# Altium schematic symbol library jlcpcb_2025_04_resistors_extended_2010.schlib: 1697 symbols (part 4 of 9) (continued)
## CR2010F24K0E04Z (continued)
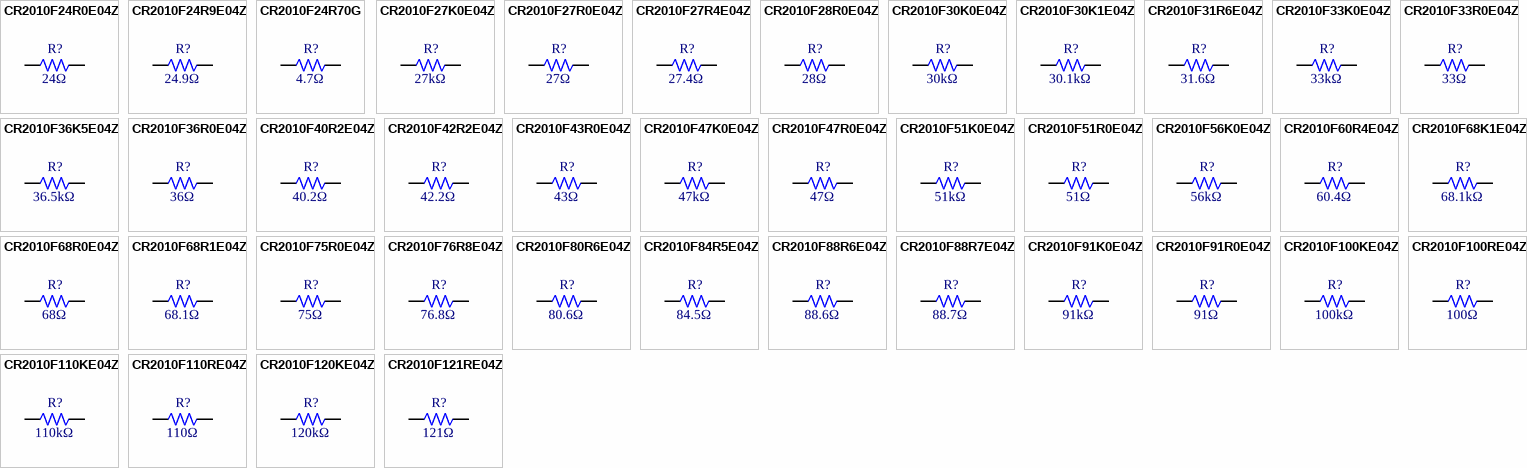
[diagram p17: symbols CR2010F24R0E04Z to CR2010F121RE04Z]

## CR2010F24R0E04Z
designator R?  Resistance: 24Ω  (hidden comment: *)
Resistor, 24Ω, ±1%, 750mW, 200V, ±100ppm/℃, -55℃~+155℃, SMD 2010; Manufacturer: Uniroyal; Manufacturer Part Number: CR2010F24R0E04Z; Supplier 1: LCSC; Supplier Part Number 1: C174973; JLCPCB Part Number: C174973; Power Rating: 750mW; Category: Resistors; Package Size: 2010; JLCPCB Basic Part: Yes; Tolerance: ±1%; Voltage Rating: 200V; Temperature Coefficient: ±100ppm/℃; Temperature Rating: -55℃~+155℃; ComponentLink1Description: Datasheet; ComponentLink1URL: https://wmsc.lcsc.com/wmsc/upload/file/pdf/v2/lcsc/2304140030_Ever-Ohms-Tech-CR2010F24R0E04Z_C174973.pdf; ComponentLink2Description: JLCPCB Part URL; ComponentLink2URL: https://jlcpcb.com/partdetail/C174973
pins: 1, 2
1 alternate drawing of the same symbol

## CR2010F24R9E04Z
designator R?  Resistance: 24.9Ω  (hidden comment: *)
Resistor, 24.9Ω, ±1%, 750mW, 200V, ±100ppm/℃, -55℃~+155℃, SMD 2010; Manufacturer: Uniroyal; Manufacturer Part Number: CR2010F24R9E04Z; Supplier 1: LCSC; Supplier Part Number 1: C174974; JLCPCB Part Number: C174974; Power Rating: 750mW; Category: Resistors; Package Size: 2010; JLCPCB Basic Part: Yes; Tolerance: ±1%; Voltage Rating: 200V; Temperature Coefficient: ±100ppm/℃; Temperature Rating: -55℃~+155℃; ComponentLink1Description: Datasheet; ComponentLink1URL: https://wmsc.lcsc.com/wmsc/upload/file/pdf/v2/lcsc/2304140030_Ever-Ohms-Tech-CR2010F24R9E04Z_C174974.pdf; ComponentLink2Description: JLCPCB Part URL; ComponentLink2URL: https://jlcpcb.com/partdetail/C174974
pins: 1, 2
1 alternate drawing of the same symbol

## CR2010F24R70G
designator R?  Resistance: 4.7Ω  (hidden comment: *)
Resistor, 4.7Ω, ±1%, 200V, SMD 2010; Manufacturer: Uniroyal; Manufacturer Part Number: CR2010F24R70G; Supplier 1: LCSC; Supplier Part Number 1: C3036992; JLCPCB Part Number: C3036992; Category: Resistors; Package Size: 2010; JLCPCB Basic Part: Yes; Tolerance: ±1%; Voltage Rating: 200V; ComponentLink1Description: Datasheet; ComponentLink1URL: https://wmsc.lcsc.com/wmsc/upload/file/pdf/v2/lcsc/2206222045_LIZ-Elec-CR2010F24R70G_C3036992.pdf; ComponentLink2Description: JLCPCB Part URL; ComponentLink2URL: https://jlcpcb.com/partdetail/C3036992
pins: 1, 2
1 alternate drawing of the same symbol

## CR2010F27K0E04Z
designator R?  Resistance: 27kΩ  (hidden comment: *)
Resistor, 27kΩ, ±1%, 750mW, 200V, ±100ppm/℃, -55℃~+155℃, SMD 2010; Manufacturer: Uniroyal; Manufacturer Part Number: CR2010F27K0E04Z; Supplier 1: LCSC; Supplier Part Number 1: C147084; JLCPCB Part Number: C147084; Power Rating: 750mW; Category: Resistors; Package Size: 2010; JLCPCB Basic Part: Yes; Tolerance: ±1%; Voltage Rating: 200V; Temperature Coefficient: ±100ppm/℃; Temperature Rating: -55℃~+155℃; ComponentLink1Description: Datasheet; ComponentLink1URL: https://wmsc.lcsc.com/wmsc/upload/file/pdf/v2/lcsc/2304140030_Ever-Ohms-Tech-CR2010F27K0E04Z_C147084.pdf; ComponentLink2Description: JLCPCB Part URL; ComponentLink2URL: https://jlcpcb.com/partdetail/C147084
pins: 1, 2
1 alternate drawing of the same symbol

## CR2010F27R0E04Z
designator R?  Resistance: 27Ω  (hidden comment: *)
Resistor, 27Ω, ±1%, 750mW, 200V, ±100ppm/℃, -55℃~+155℃, SMD 2010; Manufacturer: Uniroyal; Manufacturer Part Number: CR2010F27R0E04Z; Supplier 1: LCSC; Supplier Part Number 1: C146995; JLCPCB Part Number: C146995; Power Rating: 750mW; Category: Resistors; Package Size: 2010; JLCPCB Basic Part: Yes; Tolerance: ±1%; Voltage Rating: 200V; Temperature Coefficient: ±100ppm/℃; Temperature Rating: -55℃~+155℃; ComponentLink1Description: Datasheet; ComponentLink1URL: https://wmsc.lcsc.com/wmsc/upload/file/pdf/v2/lcsc/2304140030_Ever-Ohms-Tech-CR2010F27R0E04Z_C146995.pdf; ComponentLink2Description: JLCPCB Part URL; ComponentLink2URL: https://jlcpcb.com/partdetail/C146995
pins: 1, 2
1 alternate drawing of the same symbol

## CR2010F27R4E04Z
designator R?  Resistance: 27.4Ω  (hidden comment: *)
Resistor, 27.4Ω, ±1%, 750mW, 200V, ±100ppm/℃, -55℃~+155℃, SMD 2010; Manufacturer: Uniroyal; Manufacturer Part Number: CR2010F27R4E04Z; Supplier 1: LCSC; Supplier Part Number 1: C165391; JLCPCB Part Number: C165391; Power Rating: 750mW; Category: Resistors; Package Size: 2010; JLCPCB Basic Part: Yes; Tolerance: ±1%; Voltage Rating: 200V; Temperature Coefficient: ±100ppm/℃; Temperature Rating: -55℃~+155℃; ComponentLink1Description: Datasheet; ComponentLink1URL: https://wmsc.lcsc.com/wmsc/upload/file/pdf/v2/lcsc/2304140030_Ever-Ohms-Tech-CR2010F27R4E04Z_C165391.pdf; ComponentLink2Description: JLCPCB Part URL; ComponentLink2URL: https://jlcpcb.com/partdetail/C165391
pins: 1, 2
1 alternate drawing of the same symbol

## CR2010F28R0E04Z
designator R?  Resistance: 28Ω  (hidden comment: *)
Resistor, 28Ω, ±1%, 750mW, 200V, ±100ppm/℃, -55℃~+155℃, SMD 2010; Manufacturer: Uniroyal; Manufacturer Part Number: CR2010F28R0E04Z; Supplier 1: LCSC; Supplier Part Number 1: C174976; JLCPCB Part Number: C174976; Power Rating: 750mW; Category: Resistors; Package Size: 2010; JLCPCB Basic Part: Yes; Tolerance: ±1%; Voltage Rating: 200V; Temperature Coefficient: ±100ppm/℃; Temperature Rating: -55℃~+155℃; ComponentLink1Description: Datasheet; ComponentLink1URL: https://wmsc.lcsc.com/wmsc/upload/file/pdf/v2/lcsc/2304140030_Ever-Ohms-Tech-CR2010F28R0E04Z_C174976.pdf; ComponentLink2Description: JLCPCB Part URL; ComponentLink2URL: https://jlcpcb.com/partdetail/C174976
pins: 1, 2
1 alternate drawing of the same symbol

## CR2010F30K0E04Z
designator R?  Resistance: 30kΩ  (hidden comment: *)
Resistor, 30kΩ, ±1%, 750mW, 200V, ±100ppm/℃, -55℃~+155℃, SMD 2010; Manufacturer: Uniroyal; Manufacturer Part Number: CR2010F30K0E04Z; Supplier 1: LCSC; Supplier Part Number 1: C175093; JLCPCB Part Number: C175093; Power Rating: 750mW; Category: Resistors; Package Size: 2010; JLCPCB Basic Part: Yes; Tolerance: ±1%; Voltage Rating: 200V; Temperature Coefficient: ±100ppm/℃; Temperature Rating: -55℃~+155℃; ComponentLink1Description: Datasheet; ComponentLink1URL: https://wmsc.lcsc.com/wmsc/upload/file/pdf/v2/lcsc/2304140030_Ever-Ohms-Tech-CR2010F30K0E04Z_C175093.pdf; ComponentLink2Description: JLCPCB Part URL; ComponentLink2URL: https://jlcpcb.com/partdetail/C175093
pins: 1, 2
1 alternate drawing of the same symbol

## CR2010F30K1E04Z
designator R?  Resistance: 30.1kΩ  (hidden comment: *)
Resistor, 30.1kΩ, ±1%, 750mW, 200V, ±100ppm/℃, -55℃~+155℃, SMD 2010; Manufacturer: Uniroyal; Manufacturer Part Number: CR2010F30K1E04Z; Supplier 1: LCSC; Supplier Part Number 1: C165388; JLCPCB Part Number: C165388; Power Rating: 750mW; Category: Resistors; Package Size: 2010; JLCPCB Basic Part: Yes; Tolerance: ±1%; Voltage Rating: 200V; Temperature Coefficient: ±100ppm/℃; Temperature Rating: -55℃~+155℃; ComponentLink1Description: Datasheet; ComponentLink1URL: https://wmsc.lcsc.com/wmsc/upload/file/pdf/v2/lcsc/2304140030_Ever-Ohms-Tech-CR2010F30K1E04Z_C165388.pdf; ComponentLink2Description: JLCPCB Part URL; ComponentLink2URL: https://jlcpcb.com/partdetail/C165388
pins: 1, 2
1 alternate drawing of the same symbol

## CR2010F31R6E04Z
designator R?  Resistance: 31.6Ω  (hidden comment: *)
Resistor, 31.6Ω, ±1%, 750mW, 200V, ±100ppm/℃, -55℃~+155℃, SMD 2010; Manufacturer: Uniroyal; Manufacturer Part Number: CR2010F31R6E04Z; Supplier 1: LCSC; Supplier Part Number 1: C165387; JLCPCB Part Number: C165387; Power Rating: 750mW; Category: Resistors; Package Size: 2010; JLCPCB Basic Part: Yes; Tolerance: ±1%; Voltage Rating: 200V; Temperature Coefficient: ±100ppm/℃; Temperature Rating: -55℃~+155℃; ComponentLink1Description: Datasheet; ComponentLink1URL: https://wmsc.lcsc.com/wmsc/upload/file/pdf/v2/lcsc/2304140030_Ever-Ohms-Tech-CR2010F31R6E04Z_C165387.pdf; ComponentLink2Description: JLCPCB Part URL; ComponentLink2URL: https://jlcpcb.com/partdetail/C165387
pins: 1, 2
1 alternate drawing of the same symbol

## CR2010F33K0E04Z
designator R?  Resistance: 33kΩ  (hidden comment: *)
Resistor, 33kΩ, ±1%, 750mW, 200V, ±100ppm/℃, -55℃~+155℃, SMD 2010; Manufacturer: Uniroyal; Manufacturer Part Number: CR2010F33K0E04Z; Supplier 1: LCSC; Supplier Part Number 1: C165386; JLCPCB Part Number: C165386; Power Rating: 750mW; Category: Resistors; Package Size: 2010; JLCPCB Basic Part: Yes; Tolerance: ±1%; Voltage Rating: 200V; Temperature Coefficient: ±100ppm/℃; Temperature Rating: -55℃~+155℃; ComponentLink1Description: Datasheet; ComponentLink1URL: https://wmsc.lcsc.com/wmsc/upload/file/pdf/v2/lcsc/2304140030_Ever-Ohms-Tech-CR2010F33K0E04Z_C165386.pdf; ComponentLink2Description: JLCPCB Part URL; ComponentLink2URL: https://jlcpcb.com/partdetail/C165386
pins: 1, 2
1 alternate drawing of the same symbol

## CR2010F33R0E04Z
designator R?  Resistance: 33Ω  (hidden comment: *)
Resistor, 33Ω, ±1%, 750mW, 200V, ±100ppm/℃, -55℃~+155℃, SMD 2010; Manufacturer: Uniroyal; Manufacturer Part Number: CR2010F33R0E04Z; Supplier 1: LCSC; Supplier Part Number 1: C174978; JLCPCB Part Number: C174978; Power Rating: 750mW; Category: Resistors; Package Size: 2010; JLCPCB Basic Part: Yes; Tolerance: ±1%; Voltage Rating: 200V; Temperature Coefficient: ±100ppm/℃; Temperature Rating: -55℃~+155℃; ComponentLink1Description: Datasheet; ComponentLink1URL: https://wmsc.lcsc.com/wmsc/upload/file/pdf/v2/lcsc/2304140030_Ever-Ohms-Tech-CR2010F33R0E04Z_C174978.pdf; ComponentLink2Description: JLCPCB Part URL; ComponentLink2URL: https://jlcpcb.com/partdetail/C174978
pins: 1, 2
1 alternate drawing of the same symbol

## CR2010F36K5E04Z
designator R?  Resistance: 36.5kΩ  (hidden comment: *)
Resistor, 36.5kΩ, ±1%, 750mW, 200V, ±100ppm/℃, -55℃~+155℃, SMD 2010; Manufacturer: Uniroyal; Manufacturer Part Number: CR2010F36K5E04Z; Supplier 1: LCSC; Supplier Part Number 1: C175095; JLCPCB Part Number: C175095; Power Rating: 750mW; Category: Resistors; Package Size: 2010; JLCPCB Basic Part: Yes; Tolerance: ±1%; Voltage Rating: 200V; Temperature Coefficient: ±100ppm/℃; Temperature Rating: -55℃~+155℃; ComponentLink1Description: Datasheet; ComponentLink1URL: https://wmsc.lcsc.com/wmsc/upload/file/pdf/v2/lcsc/2304140030_Ever-Ohms-Tech-CR2010F36K5E04Z_C175095.pdf; ComponentLink2Description: JLCPCB Part URL; ComponentLink2URL: https://jlcpcb.com/partdetail/C175095
pins: 1, 2
1 alternate drawing of the same symbol

## CR2010F36R0E04Z
designator R?  Resistance: 36Ω  (hidden comment: *)
Resistor, 36Ω, ±1%, 750mW, 200V, ±100ppm/℃, -55℃~+155℃, SMD 2010; Manufacturer: Uniroyal; Manufacturer Part Number: CR2010F36R0E04Z; Supplier 1: LCSC; Supplier Part Number 1: C174981; JLCPCB Part Number: C174981; Power Rating: 750mW; Category: Resistors; Package Size: 2010; JLCPCB Basic Part: Yes; Tolerance: ±1%; Voltage Rating: 200V; Temperature Coefficient: ±100ppm/℃; Temperature Rating: -55℃~+155℃; ComponentLink1Description: Datasheet; ComponentLink1URL: https://wmsc.lcsc.com/wmsc/upload/file/pdf/v2/lcsc/2304140030_Ever-Ohms-Tech-CR2010F36R0E04Z_C174981.pdf; ComponentLink2Description: JLCPCB Part URL; ComponentLink2URL: https://jlcpcb.com/partdetail/C174981
pins: 1, 2
1 alternate drawing of the same symbol

## CR2010F40R2E04Z
designator R?  Resistance: 40.2Ω  (hidden comment: *)
Resistor, 40.2Ω, ±1%, 750mW, 200V, ±100ppm/℃, -55℃~+155℃, SMD 2010; Manufacturer: Uniroyal; Manufacturer Part Number: CR2010F40R2E04Z; Supplier 1: LCSC; Supplier Part Number 1: C175993; JLCPCB Part Number: C175993; Power Rating: 750mW; Category: Resistors; Package Size: 2010; JLCPCB Basic Part: Yes; Tolerance: ±1%; Voltage Rating: 200V; Temperature Coefficient: ±100ppm/℃; Temperature Rating: -55℃~+155℃; ComponentLink1Description: Datasheet; ComponentLink1URL: https://wmsc.lcsc.com/wmsc/upload/file/pdf/v2/lcsc/2304140030_Ever-Ohms-Tech-CR2010F40R2E04Z_C175993.pdf; ComponentLink2Description: JLCPCB Part URL; ComponentLink2URL: https://jlcpcb.com/partdetail/C175993
pins: 1, 2
1 alternate drawing of the same symbol

## CR2010F42R2E04Z
designator R?  Resistance: 42.2Ω  (hidden comment: *)
Resistor, 42.2Ω, ±1%, 750mW, 200V, ±100ppm/℃, -55℃~+155℃, SMD 2010; Manufacturer: Uniroyal; Manufacturer Part Number: CR2010F42R2E04Z; Supplier 1: LCSC; Supplier Part Number 1: C165377; JLCPCB Part Number: C165377; Power Rating: 750mW; Category: Resistors; Package Size: 2010; JLCPCB Basic Part: Yes; Tolerance: ±1%; Voltage Rating: 200V; Temperature Coefficient: ±100ppm/℃; Temperature Rating: -55℃~+155℃; ComponentLink1Description: Datasheet; ComponentLink1URL: https://wmsc.lcsc.com/wmsc/upload/file/pdf/v2/lcsc/2304140030_Ever-Ohms-Tech-CR2010F42R2E04Z_C165377.pdf; ComponentLink2Description: JLCPCB Part URL; ComponentLink2URL: https://jlcpcb.com/partdetail/C165377
pins: 1, 2
1 alternate drawing of the same symbol

## CR2010F43R0E04Z
designator R?  Resistance: 43Ω  (hidden comment: *)
Resistor, 43Ω, ±1%, 750mW, 200V, ±100ppm/℃, -55℃~+155℃, SMD 2010; Manufacturer: Uniroyal; Manufacturer Part Number: CR2010F43R0E04Z; Supplier 1: LCSC; Supplier Part Number 1: C174982; JLCPCB Part Number: C174982; Power Rating: 750mW; Category: Resistors; Package Size: 2010; JLCPCB Basic Part: Yes; Tolerance: ±1%; Voltage Rating: 200V; Temperature Coefficient: ±100ppm/℃; Temperature Rating: -55℃~+155℃; ComponentLink1Description: Datasheet; ComponentLink1URL: https://wmsc.lcsc.com/wmsc/upload/file/pdf/v2/lcsc/2304140030_Ever-Ohms-Tech-CR2010F43R0E04Z_C174982.pdf; ComponentLink2Description: JLCPCB Part URL; ComponentLink2URL: https://jlcpcb.com/partdetail/C174982
pins: 1, 2
1 alternate drawing of the same symbol

## CR2010F47K0E04Z
designator R?  Resistance: 47kΩ  (hidden comment: *)
Resistor, 47kΩ, ±1%, 750mW, 200V, ±100ppm/℃, -55℃~+155℃, SMD 2010; Manufacturer: Uniroyal; Manufacturer Part Number: CR2010F47K0E04Z; Supplier 1: LCSC; Supplier Part Number 1: C175100; JLCPCB Part Number: C175100; Power Rating: 750mW; Category: Resistors; Package Size: 2010; JLCPCB Basic Part: Yes; Tolerance: ±1%; Voltage Rating: 200V; Temperature Coefficient: ±100ppm/℃; Temperature Rating: -55℃~+155℃; ComponentLink1Description: Datasheet; ComponentLink1URL: https://wmsc.lcsc.com/wmsc/upload/file/pdf/v2/lcsc/2304140030_Ever-Ohms-Tech-CR2010F47K0E04Z_C175100.pdf; ComponentLink2Description: JLCPCB Part URL; ComponentLink2URL: https://jlcpcb.com/partdetail/C175100
pins: 1, 2
1 alternate drawing of the same symbol

## CR2010F47R0E04Z
designator R?  Resistance: 47Ω  (hidden comment: *)
Resistor, 47Ω, ±1%, 750mW, 200V, ±100ppm/℃, -55℃~+155℃, SMD 2010; Manufacturer: Uniroyal; Manufacturer Part Number: CR2010F47R0E04Z; Supplier 1: LCSC; Supplier Part Number 1: C174983; JLCPCB Part Number: C174983; Power Rating: 750mW; Category: Resistors; Package Size: 2010; JLCPCB Basic Part: Yes; Tolerance: ±1%; Voltage Rating: 200V; Temperature Coefficient: ±100ppm/℃; Temperature Rating: -55℃~+155℃; ComponentLink1Description: Datasheet; ComponentLink1URL: https://wmsc.lcsc.com/wmsc/upload/file/pdf/v2/lcsc/2304140030_Ever-Ohms-Tech-CR2010F47R0E04Z_C174983.pdf; ComponentLink2Description: JLCPCB Part URL; ComponentLink2URL: https://jlcpcb.com/partdetail/C174983
pins: 1, 2
1 alternate drawing of the same symbol

## CR2010F51K0E04Z
designator R?  Resistance: 51kΩ  (hidden comment: *)
Resistor, 51kΩ, ±1%, 750mW, 200V, ±100ppm/℃, -55℃~+155℃, SMD 2010; Manufacturer: Uniroyal; Manufacturer Part Number: CR2010F51K0E04Z; Supplier 1: LCSC; Supplier Part Number 1: C175103; JLCPCB Part Number: C175103; Power Rating: 750mW; Category: Resistors; Package Size: 2010; JLCPCB Basic Part: Yes; Tolerance: ±1%; Voltage Rating: 200V; Temperature Coefficient: ±100ppm/℃; Temperature Rating: -55℃~+155℃; ComponentLink1Description: Datasheet; ComponentLink1URL: https://wmsc.lcsc.com/wmsc/upload/file/pdf/v2/lcsc/2304140030_Ever-Ohms-Tech-CR2010F51K0E04Z_C175103.pdf; ComponentLink2Description: JLCPCB Part URL; ComponentLink2URL: https://jlcpcb.com/partdetail/C175103
pins: 1, 2
1 alternate drawing of the same symbol

## CR2010F51R0E04Z
designator R?  Resistance: 51Ω  (hidden comment: *)
Resistor, 51Ω, ±1%, 750mW, 200V, ±100ppm/℃, -55℃~+155℃, SMD 2010; Manufacturer: Uniroyal; Manufacturer Part Number: CR2010F51R0E04Z; Supplier 1: LCSC; Supplier Part Number 1: C147185; JLCPCB Part Number: C147185; Power Rating: 750mW; Category: Resistors; Package Size: 2010; JLCPCB Basic Part: Yes; Tolerance: ±1%; Voltage Rating: 200V; Temperature Coefficient: ±100ppm/℃; Temperature Rating: -55℃~+155℃; ComponentLink1Description: Datasheet; ComponentLink1URL: https://wmsc.lcsc.com/wmsc/upload/file/pdf/v2/lcsc/2304140030_Ever-Ohms-Tech-CR2010F51R0E04Z_C147185.pdf; ComponentLink2Description: JLCPCB Part URL; ComponentLink2URL: https://jlcpcb.com/partdetail/C147185
pins: 1, 2
1 alternate drawing of the same symbol

## CR2010F56K0E04Z
designator R?  Resistance: 56kΩ  (hidden comment: *)
Resistor, 56kΩ, ±1%, 750mW, 200V, ±100ppm/℃, -55℃~+155℃, SMD 2010; Manufacturer: Uniroyal; Manufacturer Part Number: CR2010F56K0E04Z; Supplier 1: LCSC; Supplier Part Number 1: C146997; JLCPCB Part Number: C146997; Power Rating: 750mW; Category: Resistors; Package Size: 2010; JLCPCB Basic Part: Yes; Tolerance: ±1%; Voltage Rating: 200V; Temperature Coefficient: ±100ppm/℃; Temperature Rating: -55℃~+155℃; ComponentLink1Description: Datasheet; ComponentLink1URL: https://wmsc.lcsc.com/wmsc/upload/file/pdf/v2/lcsc/2304140030_Ever-Ohms-Tech-CR2010F56K0E04Z_C146997.pdf; ComponentLink2Description: JLCPCB Part URL; ComponentLink2URL: https://jlcpcb.com/partdetail/C146997
pins: 1, 2
1 alternate drawing of the same symbol

## CR2010F60R4E04Z
designator R?  Resistance: 60.4Ω  (hidden comment: *)
Resistor, 60.4Ω, ±1%, 750mW, 200V, ±100ppm/℃, -55℃~+155℃, SMD 2010; Manufacturer: Uniroyal; Manufacturer Part Number: CR2010F60R4E04Z; Supplier 1: LCSC; Supplier Part Number 1: C175994; JLCPCB Part Number: C175994; Power Rating: 750mW; Category: Resistors; Package Size: 2010; JLCPCB Basic Part: Yes; Tolerance: ±1%; Voltage Rating: 200V; Temperature Coefficient: ±100ppm/℃; Temperature Rating: -55℃~+155℃; ComponentLink1Description: Datasheet; ComponentLink1URL: https://wmsc.lcsc.com/wmsc/upload/file/pdf/v2/lcsc/2304140030_Ever-Ohms-Tech-CR2010F60R4E04Z_C175994.pdf; ComponentLink2Description: JLCPCB Part URL; ComponentLink2URL: https://jlcpcb.com/partdetail/C175994
pins: 1, 2
1 alternate drawing of the same symbol

## CR2010F68K1E04Z
designator R?  Resistance: 68.1kΩ  (hidden comment: *)
Resistor, 68.1kΩ, ±1%, 750mW, 200V, ±100ppm/℃, -55℃~+155℃, SMD 2010; Manufacturer: Uniroyal; Manufacturer Part Number: CR2010F68K1E04Z; Supplier 1: LCSC; Supplier Part Number 1: C146953; JLCPCB Part Number: C146953; Power Rating: 750mW; Category: Resistors; Package Size: 2010; JLCPCB Basic Part: Yes; Tolerance: ±1%; Voltage Rating: 200V; Temperature Coefficient: ±100ppm/℃; Temperature Rating: -55℃~+155℃; ComponentLink1Description: Datasheet; ComponentLink1URL: https://wmsc.lcsc.com/wmsc/upload/file/pdf/v2/lcsc/2304140030_Ever-Ohms-Tech-CR2010F68K1E04Z_C146953.pdf; ComponentLink2Description: JLCPCB Part URL; ComponentLink2URL: https://jlcpcb.com/partdetail/C146953
pins: 1, 2
1 alternate drawing of the same symbol

## CR2010F68R0E04Z
designator R?  Resistance: 68Ω  (hidden comment: *)
Resistor, 68Ω, ±1%, 750mW, 200V, ±100ppm/℃, -55℃~+155℃, SMD 2010; Manufacturer: Uniroyal; Manufacturer Part Number: CR2010F68R0E04Z; Supplier 1: LCSC; Supplier Part Number 1: C146981; JLCPCB Part Number: C146981; Power Rating: 750mW; Category: Resistors; Package Size: 2010; JLCPCB Basic Part: Yes; Tolerance: ±1%; Voltage Rating: 200V; Temperature Coefficient: ±100ppm/℃; Temperature Rating: -55℃~+155℃; ComponentLink1Description: Datasheet; ComponentLink1URL: https://wmsc.lcsc.com/wmsc/upload/file/pdf/v2/lcsc/2304140030_Ever-Ohms-Tech-CR2010F68R0E04Z_C146981.pdf; ComponentLink2Description: JLCPCB Part URL; ComponentLink2URL: https://jlcpcb.com/partdetail/C146981
pins: 1, 2
1 alternate drawing of the same symbol

## CR2010F68R1E04Z
designator R?  Resistance: 68.1Ω  (hidden comment: *)
Resistor, 68.1Ω, ±1%, 750mW, 200V, ±100ppm/℃, -55℃~+155℃, SMD 2010; Manufacturer: Uniroyal; Manufacturer Part Number: CR2010F68R1E04Z; Supplier 1: LCSC; Supplier Part Number 1: C165369; JLCPCB Part Number: C165369; Power Rating: 750mW; Category: Resistors; Package Size: 2010; JLCPCB Basic Part: Yes; Tolerance: ±1%; Voltage Rating: 200V; Temperature Coefficient: ±100ppm/℃; Temperature Rating: -55℃~+155℃; ComponentLink1Description: Datasheet; ComponentLink1URL: https://wmsc.lcsc.com/wmsc/upload/file/pdf/v2/lcsc/2304140030_Ever-Ohms-Tech-CR2010F68R1E04Z_C165369.pdf; ComponentLink2Description: JLCPCB Part URL; ComponentLink2URL: https://jlcpcb.com/partdetail/C165369
pins: 1, 2
1 alternate drawing of the same symbol

## CR2010F75R0E04Z
designator R?  Resistance: 75Ω  (hidden comment: *)
Resistor, 75Ω, ±1%, 750mW, 200V, ±100ppm/℃, -55℃~+155℃, SMD 2010; Manufacturer: Uniroyal; Manufacturer Part Number: CR2010F75R0E04Z; Supplier 1: LCSC; Supplier Part Number 1: C174995; JLCPCB Part Number: C174995; Power Rating: 750mW; Category: Resistors; Package Size: 2010; JLCPCB Basic Part: Yes; Tolerance: ±1%; Voltage Rating: 200V; Temperature Coefficient: ±100ppm/℃; Temperature Rating: -55℃~+155℃; ComponentLink1Description: Datasheet; ComponentLink1URL: https://wmsc.lcsc.com/wmsc/upload/file/pdf/v2/lcsc/2304140030_Ever-Ohms-Tech-CR2010F75R0E04Z_C174995.pdf; ComponentLink2Description: JLCPCB Part URL; ComponentLink2URL: https://jlcpcb.com/partdetail/C174995
pins: 1, 2
1 alternate drawing of the same symbol

## CR2010F76R8E04Z
designator R?  Resistance: 76.8Ω  (hidden comment: *)
Resistor, 76.8Ω, ±1%, 750mW, 200V, ±100ppm/℃, -55℃~+155℃, SMD 2010; Manufacturer: Uniroyal; Manufacturer Part Number: CR2010F76R8E04Z; Supplier 1: LCSC; Supplier Part Number 1: C174997; JLCPCB Part Number: C174997; Power Rating: 750mW; Category: Resistors; Package Size: 2010; JLCPCB Basic Part: Yes; Tolerance: ±1%; Voltage Rating: 200V; Temperature Coefficient: ±100ppm/℃; Temperature Rating: -55℃~+155℃; ComponentLink1Description: Datasheet; ComponentLink1URL: https://wmsc.lcsc.com/wmsc/upload/file/pdf/v2/lcsc/2304140030_Ever-Ohms-Tech-CR2010F76R8E04Z_C174997.pdf; ComponentLink2Description: JLCPCB Part URL; ComponentLink2URL: https://jlcpcb.com/partdetail/C174997
pins: 1, 2
1 alternate drawing of the same symbol

## CR2010F80R6E04Z
designator R?  Resistance: 80.6Ω  (hidden comment: *)
Resistor, 80.6Ω, ±1%, 750mW, 200V, ±100ppm/℃, -55℃~+155℃, SMD 2010; Manufacturer: Uniroyal; Manufacturer Part Number: CR2010F80R6E04Z; Supplier 1: LCSC; Supplier Part Number 1: C175995; JLCPCB Part Number: C175995; Power Rating: 750mW; Category: Resistors; Package Size: 2010; JLCPCB Basic Part: Yes; Tolerance: ±1%; Voltage Rating: 200V; Temperature Coefficient: ±100ppm/℃; Temperature Rating: -55℃~+155℃; ComponentLink1Description: Datasheet; ComponentLink1URL: https://wmsc.lcsc.com/wmsc/upload/file/pdf/v2/lcsc/2304140030_Ever-Ohms-Tech-CR2010F80R6E04Z_C175995.pdf; ComponentLink2Description: JLCPCB Part URL; ComponentLink2URL: https://jlcpcb.com/partdetail/C175995
pins: 1, 2
1 alternate drawing of the same symbol

## CR2010F84R5E04Z
designator R?  Resistance: 84.5Ω  (hidden comment: *)
Resistor, 84.5Ω, ±1%, 750mW, 200V, ±100ppm/℃, -55℃~+155℃, SMD 2010; Manufacturer: Uniroyal; Manufacturer Part Number: CR2010F84R5E04Z; Supplier 1: LCSC; Supplier Part Number 1: C147232; JLCPCB Part Number: C147232; Power Rating: 750mW; Category: Resistors; Package Size: 2010; JLCPCB Basic Part: Yes; Tolerance: ±1%; Voltage Rating: 200V; Temperature Coefficient: ±100ppm/℃; Temperature Rating: -55℃~+155℃; ComponentLink1Description: Datasheet; ComponentLink1URL: https://wmsc.lcsc.com/wmsc/upload/file/pdf/v2/lcsc/2304140030_Ever-Ohms-Tech-CR2010F84R5E04Z_C147232.pdf; ComponentLink2Description: JLCPCB Part URL; ComponentLink2URL: https://jlcpcb.com/partdetail/C147232
pins: 1, 2
1 alternate drawing of the same symbol

## CR2010F88R6E04Z
designator R?  Resistance: 88.6Ω  (hidden comment: *)
Resistor, 88.6Ω, ±1%, 750mW, 200V, ±100ppm/℃, -55℃~+155℃, SMD 2010; Manufacturer: Uniroyal; Manufacturer Part Number: CR2010F88R6E04Z; Supplier 1: LCSC; Supplier Part Number 1: C175001; JLCPCB Part Number: C175001; Power Rating: 750mW; Category: Resistors; Package Size: 2010; JLCPCB Basic Part: Yes; Tolerance: ±1%; Voltage Rating: 200V; Temperature Coefficient: ±100ppm/℃; Temperature Rating: -55℃~+155℃; ComponentLink1Description: Datasheet; ComponentLink1URL: https://wmsc.lcsc.com/wmsc/upload/file/pdf/v2/lcsc/2304140030_Ever-Ohms-Tech-CR2010F88R6E04Z_C175001.pdf; ComponentLink2Description: JLCPCB Part URL; ComponentLink2URL: https://jlcpcb.com/partdetail/C175001
pins: 1, 2
1 alternate drawing of the same symbol

## CR2010F88R7E04Z
designator R?  Resistance: 88.7Ω  (hidden comment: *)
Resistor, 88.7Ω, ±1%, 750mW, 200V, ±100ppm/℃, -55℃~+155℃, SMD 2010; Manufacturer: Uniroyal; Manufacturer Part Number: CR2010F88R7E04Z; Supplier 1: LCSC; Supplier Part Number 1: C175002; JLCPCB Part Number: C175002; Power Rating: 750mW; Category: Resistors; Package Size: 2010; JLCPCB Basic Part: Yes; Tolerance: ±1%; Voltage Rating: 200V; Temperature Coefficient: ±100ppm/℃; Temperature Rating: -55℃~+155℃; ComponentLink1Description: Datasheet; ComponentLink1URL: https://wmsc.lcsc.com/wmsc/upload/file/pdf/v2/lcsc/2304140030_Ever-Ohms-Tech-CR2010F88R7E04Z_C175002.pdf; ComponentLink2Description: JLCPCB Part URL; ComponentLink2URL: https://jlcpcb.com/partdetail/C175002
pins: 1, 2
1 alternate drawing of the same symbol

## CR2010F91K0E04Z
designator R?  Resistance: 91kΩ  (hidden comment: *)
Resistor, 91kΩ, ±1%, 750mW, 200V, ±100ppm/℃, -55℃~+155℃, SMD 2010; Manufacturer: Uniroyal; Manufacturer Part Number: CR2010F91K0E04Z; Supplier 1: LCSC; Supplier Part Number 1: C175108; JLCPCB Part Number: C175108; Power Rating: 750mW; Category: Resistors; Package Size: 2010; JLCPCB Basic Part: Yes; Tolerance: ±1%; Voltage Rating: 200V; Temperature Coefficient: ±100ppm/℃; Temperature Rating: -55℃~+155℃; ComponentLink1Description: Datasheet; ComponentLink1URL: https://wmsc.lcsc.com/wmsc/upload/file/pdf/v2/lcsc/2304140030_Ever-Ohms-Tech-CR2010F91K0E04Z_C175108.pdf; ComponentLink2Description: JLCPCB Part URL; ComponentLink2URL: https://jlcpcb.com/partdetail/C175108
pins: 1, 2
1 alternate drawing of the same symbol

## CR2010F91R0E04Z
designator R?  Resistance: 91Ω  (hidden comment: *)
Resistor, 91Ω, ±1%, 750mW, 200V, ±100ppm/℃, -55℃~+155℃, SMD 2010; Manufacturer: Uniroyal; Manufacturer Part Number: CR2010F91R0E04Z; Supplier 1: LCSC; Supplier Part Number 1: C175003; JLCPCB Part Number: C175003; Power Rating: 750mW; Category: Resistors; Package Size: 2010; JLCPCB Basic Part: Yes; Tolerance: ±1%; Voltage Rating: 200V; Temperature Coefficient: ±100ppm/℃; Temperature Rating: -55℃~+155℃; ComponentLink1Description: Datasheet; ComponentLink1URL: https://wmsc.lcsc.com/wmsc/upload/file/pdf/v2/lcsc/2304140030_Ever-Ohms-Tech-CR2010F91R0E04Z_C175003.pdf; ComponentLink2Description: JLCPCB Part URL; ComponentLink2URL: https://jlcpcb.com/partdetail/C175003
pins: 1, 2
1 alternate drawing of the same symbol

## CR2010F100KE04Z
designator R?  Resistance: 100kΩ  (hidden comment: *)
Resistor, 100kΩ, ±1%, 750mW, 200V, ±100ppm/℃, -55℃~+155℃, SMD 2010; Manufacturer: Uniroyal; Manufacturer Part Number: CR2010F100KE04Z; Supplier 1: LCSC; Supplier Part Number 1: C146927; JLCPCB Part Number: C146927; Power Rating: 750mW; Category: Resistors; Package Size: 2010; JLCPCB Basic Part: Yes; Tolerance: ±1%; Voltage Rating: 200V; Temperature Coefficient: ±100ppm/℃; Temperature Rating: -55℃~+155℃; ComponentLink1Description: Datasheet; ComponentLink1URL: https://wmsc.lcsc.com/wmsc/upload/file/pdf/v2/lcsc/2304140030_Ever-Ohms-Tech-CR2010F100KE04Z_C146927.pdf; ComponentLink2Description: JLCPCB Part URL; ComponentLink2URL: https://jlcpcb.com/partdetail/C146927
pins: 1, 2
1 alternate drawing of the same symbol

## CR2010F100RE04Z
designator R?  Resistance: 100Ω  (hidden comment: *)
Resistor, 100Ω, ±1%, 750mW, 200V, ±100ppm/℃, -55℃~+155℃, SMD 2010; Manufacturer: Uniroyal; Manufacturer Part Number: CR2010F100RE04Z; Supplier 1: LCSC; Supplier Part Number 1: C175005; JLCPCB Part Number: C175005; Power Rating: 750mW; Category: Resistors; Package Size: 2010; JLCPCB Basic Part: Yes; Tolerance: ±1%; Voltage Rating: 200V; Temperature Coefficient: ±100ppm/℃; Temperature Rating: -55℃~+155℃; ComponentLink1Description: Datasheet; ComponentLink1URL: https://wmsc.lcsc.com/wmsc/upload/file/pdf/v2/lcsc/2304140030_Ever-Ohms-Tech-CR2010F100RE04Z_C175005.pdf; ComponentLink2Description: JLCPCB Part URL; ComponentLink2URL: https://jlcpcb.com/partdetail/C175005
pins: 1, 2
1 alternate drawing of the same symbol

## CR2010F110KE04Z
designator R?  Resistance: 110kΩ  (hidden comment: *)
Resistor, 110kΩ, ±1%, 750mW, 200V, ±100ppm/℃, -55℃~+155℃, SMD 2010; Manufacturer: Uniroyal; Manufacturer Part Number: CR2010F110KE04Z; Supplier 1: LCSC; Supplier Part Number 1: C147179; JLCPCB Part Number: C147179; Power Rating: 750mW; Category: Resistors; Package Size: 2010; JLCPCB Basic Part: Yes; Tolerance: ±1%; Voltage Rating: 200V; Temperature Coefficient: ±100ppm/℃; Temperature Rating: -55℃~+155℃; ComponentLink1Description: Datasheet; ComponentLink1URL: https://wmsc.lcsc.com/wmsc/upload/file/pdf/v2/lcsc/2304140030_Ever-Ohms-Tech-CR2010F110KE04Z_C147179.pdf; ComponentLink2Description: JLCPCB Part URL; ComponentLink2URL: https://jlcpcb.com/partdetail/C147179
pins: 1, 2
1 alternate drawing of the same symbol

## CR2010F110RE04Z
designator R?  Resistance: 110Ω  (hidden comment: *)
Resistor, 110Ω, ±1%, 750mW, 200V, ±100ppm/℃, -55℃~+155℃, SMD 2010; Manufacturer: Uniroyal; Manufacturer Part Number: CR2010F110RE04Z; Supplier 1: LCSC; Supplier Part Number 1: C175006; JLCPCB Part Number: C175006; Power Rating: 750mW; Category: Resistors; Package Size: 2010; JLCPCB Basic Part: Yes; Tolerance: ±1%; Voltage Rating: 200V; Temperature Coefficient: ±100ppm/℃; Temperature Rating: -55℃~+155℃; ComponentLink1Description: Datasheet; ComponentLink1URL: https://wmsc.lcsc.com/wmsc/upload/file/pdf/v2/lcsc/2304140030_Ever-Ohms-Tech-CR2010F110RE04Z_C175006.pdf; ComponentLink2Description: JLCPCB Part URL; ComponentLink2URL: https://jlcpcb.com/partdetail/C175006
pins: 1, 2
1 alternate drawing of the same symbol

## CR2010F120KE04Z
designator R?  Resistance: 120kΩ  (hidden comment: *)
Resistor, 120kΩ, ±1%, 750mW, 200V, ±100ppm/℃, -55℃~+155℃, SMD 2010; Manufacturer: Uniroyal; Manufacturer Part Number: CR2010F120KE04Z; Supplier 1: LCSC; Supplier Part Number 1: C175110; JLCPCB Part Number: C175110; Power Rating: 750mW; Category: Resistors; Package Size: 2010; JLCPCB Basic Part: Yes; Tolerance: ±1%; Voltage Rating: 200V; Temperature Coefficient: ±100ppm/℃; Temperature Rating: -55℃~+155℃; ComponentLink1Description: Datasheet; ComponentLink1URL: https://wmsc.lcsc.com/wmsc/upload/file/pdf/v2/lcsc/2304140030_Ever-Ohms-Tech-CR2010F120KE04Z_C175110.pdf; ComponentLink2Description: JLCPCB Part URL; ComponentLink2URL: https://jlcpcb.com/partdetail/C175110
pins: 1, 2
1 alternate drawing of the same symbol

## CR2010F121RE04Z
designator R?  Resistance: 121Ω  (hidden comment: *)
Resistor, 121Ω, ±1%, 750mW, 200V, ±100ppm/℃, -55℃~+155℃, SMD 2010; Manufacturer: Uniroyal; Manufacturer Part Number: CR2010F121RE04Z; Supplier 1: LCSC; Supplier Part Number 1: C175008; JLCPCB Part Number: C175008; Power Rating: 750mW; Category: Resistors; Package Size: 2010; JLCPCB Basic Part: Yes; Tolerance: ±1%; Voltage Rating: 200V; Temperature Coefficient: ±100ppm/℃; Temperature Rating: -55℃~+155℃; ComponentLink1Description: Datasheet; ComponentLink1URL: https://wmsc.lcsc.com/wmsc/upload/file/pdf/v2/lcsc/2304140030_Ever-Ohms-Tech-CR2010F121RE04Z_C175008.pdf; ComponentLink2Description: JLCPCB Part URL; ComponentLink2URL: https://jlcpcb.com/partdetail/C175008
pins: 1, 2
1 alternate drawing of the same symbol

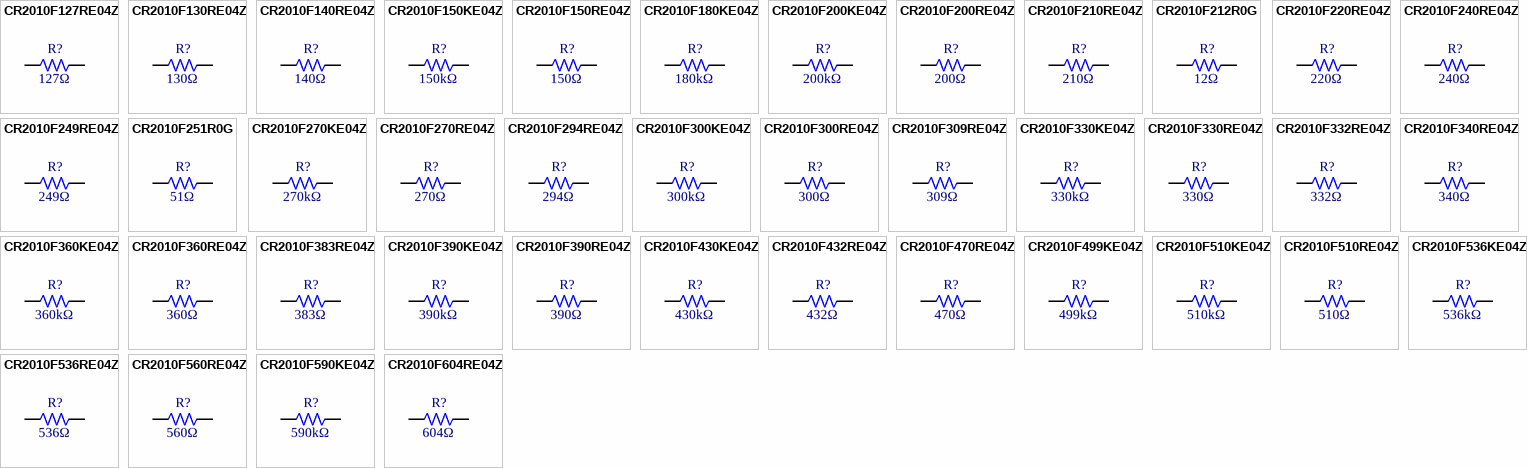
[diagram p18: symbols CR2010F127RE04Z to CR2010F604RE04Z]

## CR2010F127RE04Z
designator R?  Resistance: 127Ω  (hidden comment: *)
Resistor, 127Ω, ±1%, 750mW, 200V, ±100ppm/℃, -55℃~+155℃, SMD 2010; Manufacturer: Uniroyal; Manufacturer Part Number: CR2010F127RE04Z; Supplier 1: LCSC; Supplier Part Number 1: C175009; JLCPCB Part Number: C175009; Power Rating: 750mW; Category: Resistors; Package Size: 2010; JLCPCB Basic Part: Yes; Tolerance: ±1%; Voltage Rating: 200V; Temperature Coefficient: ±100ppm/℃; Temperature Rating: -55℃~+155℃; ComponentLink1Description: Datasheet; ComponentLink1URL: https://wmsc.lcsc.com/wmsc/upload/file/pdf/v2/lcsc/2304140030_Ever-Ohms-Tech-CR2010F127RE04Z_C175009.pdf; ComponentLink2Description: JLCPCB Part URL; ComponentLink2URL: https://jlcpcb.com/partdetail/C175009
pins: 1, 2
1 alternate drawing of the same symbol

## CR2010F130RE04Z
designator R?  Resistance: 130Ω  (hidden comment: *)
Resistor, 130Ω, ±1%, 750mW, 200V, ±100ppm/℃, -55℃~+155℃, SMD 2010; Manufacturer: Uniroyal; Manufacturer Part Number: CR2010F130RE04Z; Supplier 1: LCSC; Supplier Part Number 1: C175010; JLCPCB Part Number: C175010; Power Rating: 750mW; Category: Resistors; Package Size: 2010; JLCPCB Basic Part: Yes; Tolerance: ±1%; Voltage Rating: 200V; Temperature Coefficient: ±100ppm/℃; Temperature Rating: -55℃~+155℃; ComponentLink1Description: Datasheet; ComponentLink1URL: https://wmsc.lcsc.com/wmsc/upload/file/pdf/v2/lcsc/2304140030_Ever-Ohms-Tech-CR2010F130RE04Z_C175010.pdf; ComponentLink2Description: JLCPCB Part URL; ComponentLink2URL: https://jlcpcb.com/partdetail/C175010
pins: 1, 2
1 alternate drawing of the same symbol

## CR2010F140RE04Z
designator R?  Resistance: 140Ω  (hidden comment: *)
Resistor, 140Ω, ±1%, 750mW, 200V, ±100ppm/℃, -55℃~+155℃, SMD 2010; Manufacturer: Uniroyal; Manufacturer Part Number: CR2010F140RE04Z; Supplier 1: LCSC; Supplier Part Number 1: C175012; JLCPCB Part Number: C175012; Power Rating: 750mW; Category: Resistors; Package Size: 2010; JLCPCB Basic Part: Yes; Tolerance: ±1%; Voltage Rating: 200V; Temperature Coefficient: ±100ppm/℃; Temperature Rating: -55℃~+155℃; ComponentLink1Description: Datasheet; ComponentLink1URL: https://wmsc.lcsc.com/wmsc/upload/file/pdf/v2/lcsc/2304140030_Ever-Ohms-Tech-CR2010F140RE04Z_C175012.pdf; ComponentLink2Description: JLCPCB Part URL; ComponentLink2URL: https://jlcpcb.com/partdetail/C175012
pins: 1, 2
1 alternate drawing of the same symbol

## CR2010F150KE04Z
designator R?  Resistance: 150kΩ  (hidden comment: *)
Resistor, 150kΩ, ±1%, 750mW, 200V, ±100ppm/℃, -55℃~+155℃, SMD 2010; Manufacturer: Uniroyal; Manufacturer Part Number: CR2010F150KE04Z; Supplier 1: LCSC; Supplier Part Number 1: C147065; JLCPCB Part Number: C147065; Power Rating: 750mW; Category: Resistors; Package Size: 2010; JLCPCB Basic Part: Yes; Tolerance: ±1%; Voltage Rating: 200V; Temperature Coefficient: ±100ppm/℃; Temperature Rating: -55℃~+155℃; ComponentLink1Description: Datasheet; ComponentLink1URL: https://wmsc.lcsc.com/wmsc/upload/file/pdf/v2/lcsc/2304140030_Ever-Ohms-Tech-CR2010F150KE04Z_C147065.pdf; ComponentLink2Description: JLCPCB Part URL; ComponentLink2URL: https://jlcpcb.com/partdetail/C147065
pins: 1, 2
1 alternate drawing of the same symbol

## CR2010F150RE04Z
designator R?  Resistance: 150Ω  (hidden comment: *)
Resistor, 150Ω, ±1%, 750mW, 200V, ±100ppm/℃, -55℃~+155℃, SMD 2010; Manufacturer: Uniroyal; Manufacturer Part Number: CR2010F150RE04Z; Supplier 1: LCSC; Supplier Part Number 1: C146933; JLCPCB Part Number: C146933; Power Rating: 750mW; Category: Resistors; Package Size: 2010; JLCPCB Basic Part: Yes; Tolerance: ±1%; Voltage Rating: 200V; Temperature Coefficient: ±100ppm/℃; Temperature Rating: -55℃~+155℃; ComponentLink1Description: Datasheet; ComponentLink1URL: https://wmsc.lcsc.com/wmsc/upload/file/pdf/v2/lcsc/2304140030_Ever-Ohms-Tech-CR2010F150RE04Z_C146933.pdf; ComponentLink2Description: JLCPCB Part URL; ComponentLink2URL: https://jlcpcb.com/partdetail/C146933
pins: 1, 2
1 alternate drawing of the same symbol

## CR2010F180KE04Z
designator R?  Resistance: 180kΩ  (hidden comment: *)
Resistor, 180kΩ, ±1%, 750mW, 200V, ±100ppm/℃, -55℃~+155℃, SMD 2010; Manufacturer: Uniroyal; Manufacturer Part Number: CR2010F180KE04Z; Supplier 1: LCSC; Supplier Part Number 1: C146994; JLCPCB Part Number: C146994; Power Rating: 750mW; Category: Resistors; Package Size: 2010; JLCPCB Basic Part: Yes; Tolerance: ±1%; Voltage Rating: 200V; Temperature Coefficient: ±100ppm/℃; Temperature Rating: -55℃~+155℃; ComponentLink1Description: Datasheet; ComponentLink1URL: https://wmsc.lcsc.com/wmsc/upload/file/pdf/v2/lcsc/2304140030_Ever-Ohms-Tech-CR2010F180KE04Z_C146994.pdf; ComponentLink2Description: JLCPCB Part URL; ComponentLink2URL: https://jlcpcb.com/partdetail/C146994
pins: 1, 2
1 alternate drawing of the same symbol

## CR2010F200KE04Z
designator R?  Resistance: 200kΩ  (hidden comment: *)
Resistor, 200kΩ, ±1%, 750mW, 200V, ±100ppm/℃, -55℃~+155℃, SMD 2010; Manufacturer: Uniroyal; Manufacturer Part Number: CR2010F200KE04Z; Supplier 1: LCSC; Supplier Part Number 1: C175114; JLCPCB Part Number: C175114; Power Rating: 750mW; Category: Resistors; Package Size: 2010; JLCPCB Basic Part: Yes; Tolerance: ±1%; Voltage Rating: 200V; Temperature Coefficient: ±100ppm/℃; Temperature Rating: -55℃~+155℃; ComponentLink1Description: Datasheet; ComponentLink1URL: https://wmsc.lcsc.com/wmsc/upload/file/pdf/v2/lcsc/2304140030_Ever-Ohms-Tech-CR2010F200KE04Z_C175114.pdf; ComponentLink2Description: JLCPCB Part URL; ComponentLink2URL: https://jlcpcb.com/partdetail/C175114
pins: 1, 2
1 alternate drawing of the same symbol

## CR2010F200RE04Z
designator R?  Resistance: 200Ω  (hidden comment: *)
Resistor, 200Ω, ±1%, 750mW, 200V, ±100ppm/℃, -55℃~+155℃, SMD 2010; Manufacturer: Uniroyal; Manufacturer Part Number: CR2010F200RE04Z; Supplier 1: LCSC; Supplier Part Number 1: C175019; JLCPCB Part Number: C175019; Power Rating: 750mW; Category: Resistors; Package Size: 2010; JLCPCB Basic Part: Yes; Tolerance: ±1%; Voltage Rating: 200V; Temperature Coefficient: ±100ppm/℃; Temperature Rating: -55℃~+155℃; ComponentLink1Description: Datasheet; ComponentLink1URL: https://wmsc.lcsc.com/wmsc/upload/file/pdf/v2/lcsc/2304140030_Ever-Ohms-Tech-CR2010F200RE04Z_C175019.pdf; ComponentLink2Description: JLCPCB Part URL; ComponentLink2URL: https://jlcpcb.com/partdetail/C175019
pins: 1, 2
1 alternate drawing of the same symbol

## CR2010F210RE04Z
designator R?  Resistance: 210Ω  (hidden comment: *)
Resistor, 210Ω, ±1%, 750mW, 200V, ±100ppm/℃, -55℃~+155℃, SMD 2010; Manufacturer: Uniroyal; Manufacturer Part Number: CR2010F210RE04Z; Supplier 1: LCSC; Supplier Part Number 1: C175021; JLCPCB Part Number: C175021; Power Rating: 750mW; Category: Resistors; Package Size: 2010; JLCPCB Basic Part: Yes; Tolerance: ±1%; Voltage Rating: 200V; Temperature Coefficient: ±100ppm/℃; Temperature Rating: -55℃~+155℃; ComponentLink1Description: Datasheet; ComponentLink1URL: https://wmsc.lcsc.com/wmsc/upload/file/pdf/v2/lcsc/2304140030_Ever-Ohms-Tech-CR2010F210RE04Z_C175021.pdf; ComponentLink2Description: JLCPCB Part URL; ComponentLink2URL: https://jlcpcb.com/partdetail/C175021
pins: 1, 2
1 alternate drawing of the same symbol
